# Altium footprint library CRD25DA12N-FMC.PcbLib: 152 footprints (part 1 of 10)
Each footprint in its own frame and in the unit in brackets; x right, y up, seen from the top. Pads: shape width x height; smd on the part's side, far side on the other; paste and mask are expansions set on the pad; w line width, h text height; cw(c..) or ccw(c..) is an arc to the next point about the centre after c.
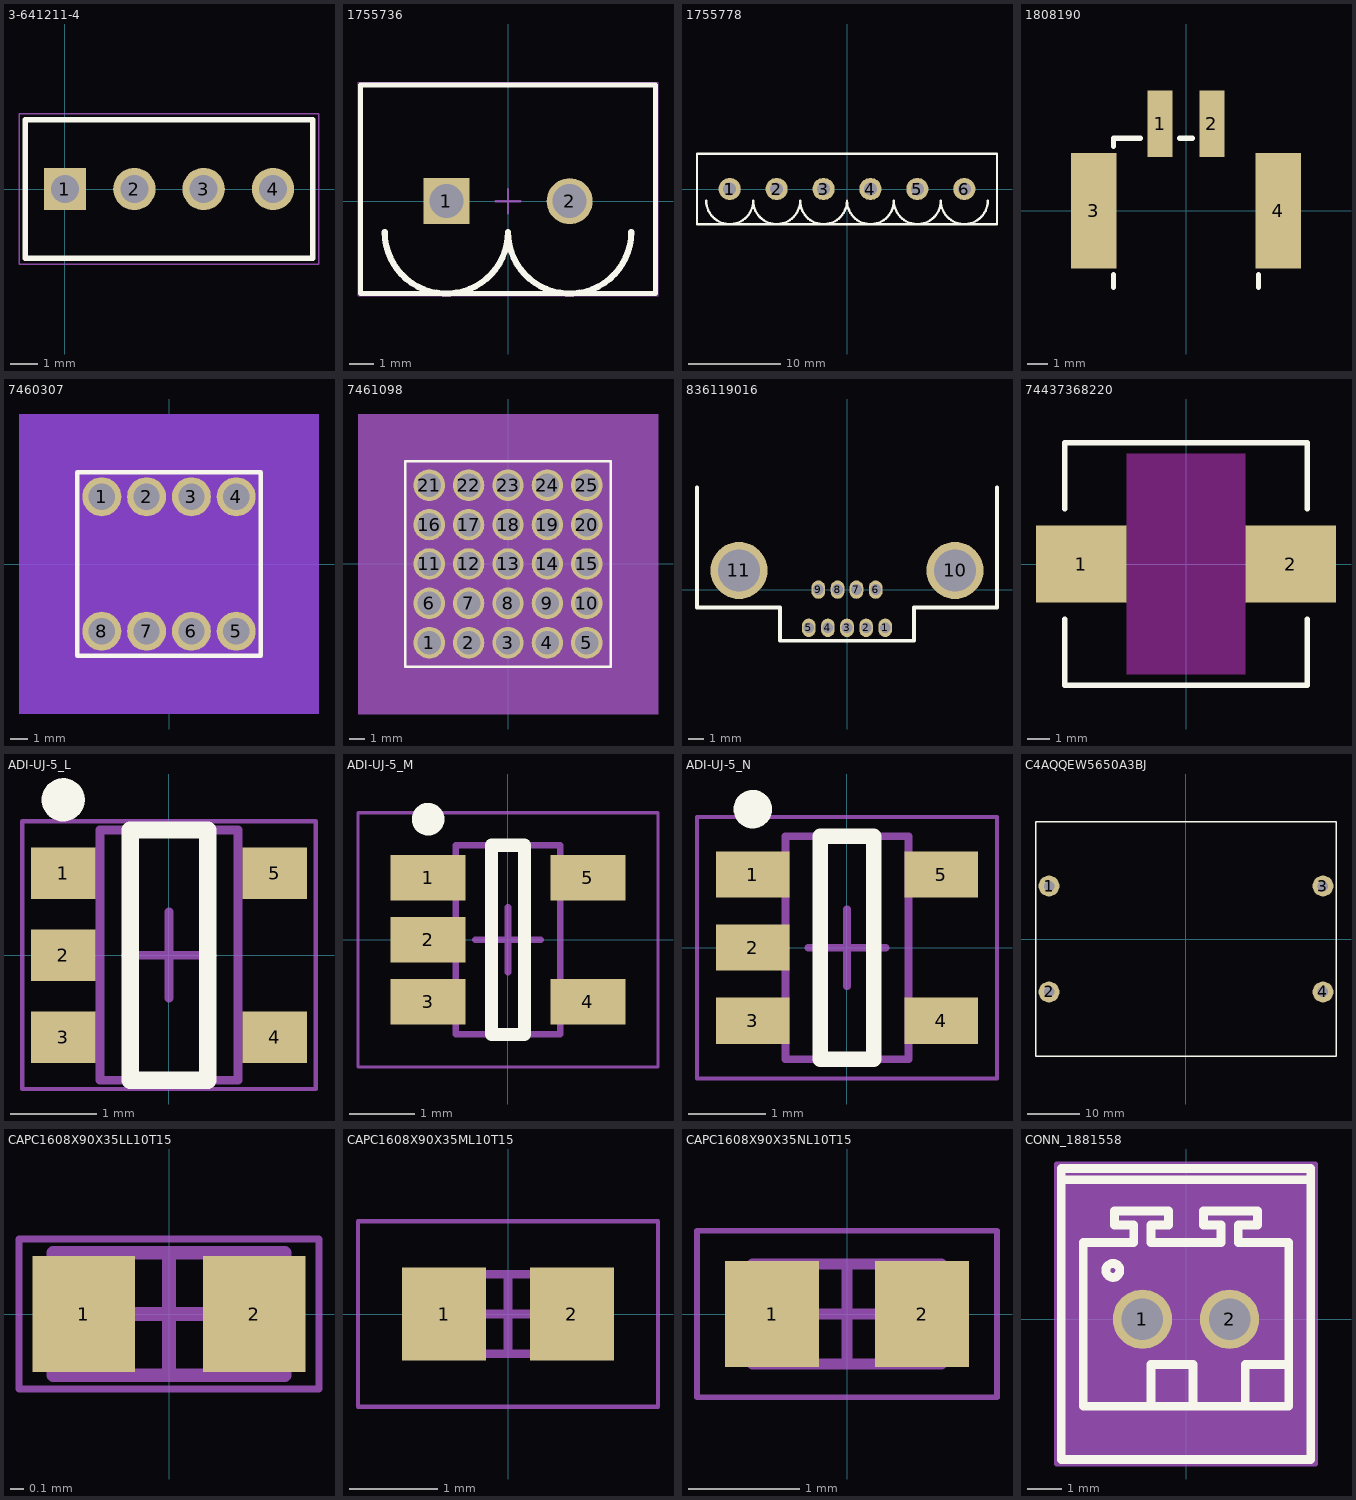
[diagram p0: the footprints below, top view; thin cyan lines are the x and y axes]

## 3-641211-4 [mm] "Connector Header Through Hole 4 position 0.100\" (2.54mm)"
height 10.03
pads (4):
  rect 1.55x1.55 hole 1.02: 1(0,0)
  round 1.55 hole 1.02: 2(2.54,0) 3(5.08,0) 4(7.62,0)
Top Overlay:
  lines w0.2: -1.46,-2.54 -1.46,2.54 9.08,2.54 9.08,-2.54 -1.46,-2.54
Mechanical 13:
  lines w0.1: -1.46,-2.54 -1.46,2.54 9.08,2.54 9.08,-2.54 -1.46,-2.54
Mechanical 15:
  lines w0.05: -1.685,-2.765 -1.685,2.765 9.305,2.765 9.305,-2.765 -1.685,-2.765
3D body "TE 3-641211-4 Color.STEP": height 10.09, standoff -3.5, extent -1.28,-2.54 8.88,2.54

## 1755736 [mm] "THD, 2-Leads, Body 12.16x8.6mm, Pitch 5.08mm"
height 12
pads (2):
  rect 1.9x1.9 hole 1.4: 1(-2.54,0)
  round 1.9 hole 1.4: 2(2.54,0)
Top Overlay:
  lines w0.2: -6.08,-3.81 -6.08,4.79 6.08,4.79 6.08,-3.81 -6.08,-3.81
  lines w0.254: -5.08,-1.27 ccw(c-2.54,-1.27) 0,-1.27 ccw(c2.54,-1.27) 5.08,-1.27
Mechanical 13:
  lines w0.1: -6.08,-3.8 6.08,-3.8 6.08,4.8 -6.08,4.8 -6.08,-3.8
Mechanical 15:
  lines w0.05: -6.18,-3.9 -6.18,4.9 6.18,4.9 6.18,-3.9 -6.18,-3.9
  lines w0.1: -0.5,0 0.5,0 ; 0,-0.5 0,0.5
3D body: height 10, standoff -3.9, extent -3.04,-0.499 -2.044,0.499
3D body: height 10, standoff -3.9, extent 2.04,-0.499 3.036,0.499
3D body: height 12, standoff 4, extent -6.079,-3.799 6.079,4.799
3D body "Phoenix Contact 1755736.stp": height 12, standoff -3.9, extent -6,-3.7 6.16,4.87

## 1755778 [mm] "TERM BLOCK HDR 6POS VERT 5.08MM"
pads (6):
  round 2.4 hole 1.4: 1(-12.7,0) 2(-7.62,0) 3(-2.54,0) 4(2.54,0) 5(7.62,0) 6(12.7,0)
Top Overlay:
  lines w0.254: -15.24,-1.27 ccw(c-12.7,-1.27) -10.16,-1.27 ccw(c-7.62,-1.27) -5.08,-1.27 ccw(c-2.54,-1.27) 0,-1.27 ccw(c2.54,-1.27) 5.08,-1.27 ccw(c7.62,-1.27) 10.16,-1.27 ccw(c12.7,-1.27) 15.24,-1.27 ; -16.24,-3.835 16.24,-3.835 16.24,3.835 -16.24,3.835 -16.24,-3.835
3D body "Phoenix Contact 1755778.stp": height 12, standoff -3.9, extent -16.24,-3.835 16.24,4.765

## 1808190 [mm]
pads (4):
  rect 1.2x3.2 smd: 1(-1.25,4.2) 2(1.25,4.2)
  rect 2.2x5.6 smd: 3(-4.45,0) 4(4.45,0)
Top Overlay:
  lines w0.254: -3.5,-3.7 -3.5,-3.1 ; -3.5,3.1 -3.5,3.5 -2.2,3.5 ; -0.3,3.5 0.3,3.5 ; 3.5,-3.7 3.5,-3.1
3D body "1808190.step": height 5, standoff 0, extent -5.4,-4 5.2,5.5

## 7460307 [mm] "8 Pin Screw Terminal, Power Tap M4 Through Hole"
pads (8):
  round 2.21 hole 1.475: 1(-3.81,3.81) 2(-1.27,3.81) 3(1.27,3.81) 4(3.81,3.81) 5(3.81,-3.81) 6(1.27,-3.81) 7(-1.27,-3.81) 8(-3.81,-3.81)
Top Layer keep-out:
  rectangle: -8.5,-8.5 8.5,8.5
Bottom Layer keep-out:
  rectangle: -8.5,-8.5 8.5,8.5
Top Overlay:
  lines w0.254: -5.2,-5.2 -5.2,5.2 5.2,5.2 5.2,-5.2 -5.2,-5.2
3D body "Wurth 7460307 - Modified.STEP": height 7, standoff -3.5, extent -4.5,-4.5 4.5,4.5

## 7461098 [mil]
pads (25):
  round 80 hole 60 mask+0: 1(-200,-200) 2(-100,-200) 3(0,-200) 4(100,-200) 5(200,-200) 6(-200,-100) 7(-100,-100) 8(0,-100) 9(100,-100) 10(200,-100) 11(-200,0) 12(-100,0) 13(0,0) 14(100,0) 15(200,0) 16(-200,100) 17(-100,100) 18(0,100) 19(100,100) 20(200,100) 21(-200,200) 22(-100,200) 23(0,200) 24(100,200) 25(200,200)
Top Overlay:
  lines w6: -261,-261.09 261,-261.09 261,260.91 -261,260.91 -261,-261.09
Mechanical 5:
  region: -381,380.91 381,380.91 381,-381.09 -381,-381.09
Mechanical 13:
  lines w1: -256,-256.09 256,-256.09 256,255.91 -256,255.91 -256,-256.09
Mechanical 15:
  region: 266,265.91 -266,265.91 -266,-266.09 266,-266.09
  lines w6: -266,-266.09 -266,265.91 266,265.91 266,-266.09 -266,-266.09
3D body: height 10, standoff 0, extent -200,-200 -190,-190
3D body "7461098_Download_STP_7461098_rev1.stp": height 610.24, standoff -137.8, extent -255.91,-255.91 255.91,255.91

## 836119016 [mm]
pads (11):
  oval 0.91x1.218 hole 0.71: 1(2.54,-2.54) 2(1.27,-2.54) 3(0,-2.54) 4(-1.27,-2.54) 5(-2.54,-2.54) 6(1.905,0) 7(0.625,0) 8(-0.625,0) 9(-1.905,0)
  round 3.79 hole 2.79: 10(7.175,1.27) 11(-7.175,1.27)
Top Overlay:
  lines w0.254: -9.965,6.8 -9.965,-1.2 -4.46,-1.2 -4.46,-3.4 4.46,-3.4 4.46,-1.2 9.965,-1.2 9.965,6.8
3D body "Molex 836119016 Color.STEP": height 7.99, standoff -2.61, extent -9.938,-3.491 9.912,11.419

## 74437368220 [mm]
pads (2):
  rect 4.1x3.5 smd: 1(-4.75,0) 2(4.75,0)
Top Layer keep-out:
  rectangle: -2.7,-5 2.7,5
Top Overlay:
  lines w0.254: -5.5,-2.5 -5.5,-5.5 5.5,-5.5 5.5,-2.5 ; -5.5,2.5 -5.5,5.5 5.5,5.5 5.5,2.5
Top Solder:
  rectangle: -2.7,-5.6 2.7,5.6
3D body "WE-LHMI_1040 (rev1).stp": height 3.7, standoff -0.1, extent -5.5,-5 5.5,5

## ADI-UJ-5_L [mm] "SOT23, 5-Leads, Body 2.9x1.6mm, Pitch 0.95mm, IPC High Density"
height 1
pads (5):
  rect 0.75x0.6 smd: 1(-1.225,0.95) 2(-1.225,0) 3(-1.225,-0.95) 4(1.225,-0.95) 5(1.225,0.95)
Top Overlay:
  circle w0.25: c-1.225,1.8 r0.125
  lines w0.2: -0.45,-1.45 -0.45,1.45 0.45,1.45 0.45,-1.45 -0.45,-1.45
Mechanical 13:
  lines w0.1: -0.8,-1.45 0.8,-1.45 0.8,1.45 -0.8,1.45 -0.8,-1.45
Mechanical 15:
  lines w0.05: -1.7,-1.55 1.7,-1.55 1.7,1.55 -1.7,1.55 -1.7,-1.55
  lines w0.1: -0.5,0 0.5,0 ; 0,-0.5 0,0.5
3D body: height 1, standoff 0, extent -0.8,-1.45 0.8,1.45

## ADI-UJ-5_M [mm] "SOT23, 5-Leads, Body 2.9x1.6mm, Pitch 0.95mm, IPC Low Density"
height 1
pads (5):
  rect 1.15x0.7 smd: 1(-1.225,0.95) 2(-1.225,0) 3(-1.225,-0.95) 4(1.225,-0.95) 5(1.225,0.95)
Top Overlay:
  circle w0.25: c-1.225,1.85 r0.125
  lines w0.2: -0.25,-1.45 -0.25,1.45 0.25,1.45 0.25,-1.45 -0.25,-1.45
Mechanical 13:
  lines w0.1: -0.8,-1.45 0.8,-1.45 0.8,1.45 -0.8,1.45 -0.8,-1.45
Mechanical 15:
  lines w0.05: -2.3,-1.95 2.3,-1.95 2.3,1.95 -2.3,1.95 -2.3,-1.95
  lines w0.1: -0.5,0 0.5,0 ; 0,-0.5 0,0.5
3D body: height 1, standoff 0, extent -0.8,-1.45 0.8,1.45

## ADI-UJ-5_N [mm] "SOT23, 5-Leads, Body 2.9x1.6mm, Pitch 0.95mm, IPC Medium Density"
height 1
pads (5):
  rect 0.95x0.6 smd: 1(-1.225,0.95) 2(-1.225,0) 3(-1.225,-0.95) 4(1.225,-0.95) 5(1.225,0.95)
Top Overlay:
  circle w0.25: c-1.225,1.8 r0.125
  lines w0.2: -0.35,-1.45 0.35,-1.45 0.35,1.45 -0.35,1.45 -0.35,-1.45
Mechanical 13:
  lines w0.1: -0.8,-1.45 -0.8,1.45 0.8,1.45 0.8,-1.45 -0.8,-1.45
Mechanical 15:
  lines w0.05: -1.95,-1.7 -1.95,1.7 1.95,1.7 1.95,-1.7 -1.95,-1.7
  lines w0.1: -0.5,0 0.5,0 ; 0,-0.5 0,0.5
3D body: height 1, standoff 0, extent -0.8,-1.45 0.8,1.45

## C4AQQEW5650A3BJ [mm] "CAP FILM 65UF 5% 1.1KVDC RAD"
pads (4):
  round 4 hole 2: 1(-26.25,10.15) 2(-26.25,-10.15) 3(26.25,10.15) 4(26.25,-10.15)
Top Overlay:
  lines w0.254: -28.75,-22.5 28.75,-22.5 28.75,22.5 -28.75,22.5 -28.75,-22.5
3D body "Kemet C4AQQEW5650A3BJ.step": height 65.4, standoff -5.9, extent -29.15,-22.755 29.15,22.75

## CAPC1608X90X35LL10T15 [mm] "Chip Capacitor, 2-Leads, Body 1.60x0.80mm, IPC High Density"
height 0.9
pads (2):
  rect 0.75x0.85 smd: 1(-0.625,0) 2(0.625,0)
Mechanical 13:
  lines w0.1: -0.85,-0.45 -0.85,0.45 0.85,0.45 0.85,-0.45 -0.85,-0.45
Mechanical 15:
  lines w0.05: -1.1,-0.55 -1.1,0.55 1.1,0.55 1.1,-0.55 -1.1,-0.55
  lines w0.1: -0.45,0 0.45,0 ; 0,-0.45 0,0.45
3D body: height 0.9, standoff 0, extent -0.5,-0.45 0.5,0.45
3D body: height 0.9, standoff 0, extent -0.85,-0.45 -0.5,0.45
3D body: height 0.9, standoff 0, extent 0.5,-0.45 0.85,0.45

## CAPC1608X90X35ML10T15 [mm] "Chip Capacitor, 2-Leads, Body 1.60x0.80mm, IPC Low Density"
height 0.9
pads (2):
  rect 0.95x1.05 smd: 1(-0.725,0) 2(0.725,0)
Mechanical 13:
  lines w0.1: -0.85,-0.45 0.85,-0.45 0.85,0.45 -0.85,0.45 -0.85,-0.45
Mechanical 15:
  lines w0.05: -1.7,-1.05 1.7,-1.05 1.7,1.05 -1.7,1.05 -1.7,-1.05
  lines w0.1: -0.45,0 0.45,0 ; 0,-0.45 0,0.45
3D body: height 0.9, standoff 0, extent 0.5,-0.45 0.85,0.45
3D body: height 0.9, standoff 0, extent -0.85,-0.45 -0.5,0.45
3D body: height 0.9, standoff 0, extent -0.5,-0.45 0.5,0.45

## CAPC1608X90X35NL10T15 [mm] "Chip Capacitor, 2-Leads, Body 1.60x0.80mm, IPC Medium Density"
height 0.9
pads (2):
  rect 0.85x0.95 smd: 1(-0.675,0) 2(0.675,0)
Mechanical 13:
  lines w0.1: -0.85,-0.45 0.85,-0.45 0.85,0.45 -0.85,0.45 -0.85,-0.45
Mechanical 15:
  lines w0.05: -1.35,-0.75 1.35,-0.75 1.35,0.75 -1.35,0.75 -1.35,-0.75
  lines w0.1: -0.45,0 0.45,0 ; 0,-0.45 0,0.45
3D body: height 0.9, standoff 0, extent 0.5,-0.45 0.85,0.45
3D body: height 0.9, standoff 0, extent -0.85,-0.45 -0.5,0.45
3D body: height 0.9, standoff 0, extent -0.5,-0.45 0.5,0.45

## CONN_1881558 [mil]
pads (2):
  round 67 / inner round 60 / far side round 67 hole 47 paste-99999 mask+0: 1(-49.21,0) 2(49.21,0)
Top Overlay:
  circle w10: c-82.68,55.12 r7.87
  lines w10: -140.98,157.48 138.54,157.48 ; -80.71,106.3 -80.71,122.05 ; -78.74,106.3 -59.06,106.3 -59.06,86.61 ; -78.74,122.05 -19.68,122.05 -19.68,106.3 -39.37,106.3 -39.37,86.61 0,86.61 39.37,86.61 39.37,106.3 19.68,106.3 19.68,122.05 78.74,122.05 ; -61.02,86.61 -116.14,86.61 -116.14,-98.43 7.87,-98.43 7.87,-51.18 -39.37,-51.18 -39.37,-97.44 ; 0,-98.43 116.14,-98.43 116.14,86.61 61.02,86.61 ; 59.06,86.61 59.06,106.3 78.74,106.3 ; 66.93,-96.46 66.93,-51.18 113.19,-51.18 ; 80.71,106.3 80.71,122.05 ; -141,-158.65 -141,170.35 141,170.35 141,-158.65 -141,-158.65
Mechanical 13:
  circle w20: c-49.21,-75 r15
  lines w1: -136,-153.65 -136,165.35 136,165.35 136,-153.65 -136,-153.65
Mechanical 15:
  region: 146,175.35 -146,175.35 -146,-163.65 146,-163.65
  lines w6: -146,-163.65 146,-163.65 146,175.35 -146,175.35 -146,-163.65
3D body "pxc_1881558_01_MCV-0-5-2-G-2-5_3D.stp": height 397.64, standoff -137.8, extent -135.83,-153.54 135.83,165.35